# Altium footprint library PCB_IntegratedCircuit.PcbLib: 82 footprints (part 6 of 6)
Each footprint in its own frame and in the unit in brackets; x right, y up, seen from the top. Pads: shape width x height; smd on the part's side, far side on the other; paste and mask are expansions set on the pad; w line width, h text height; cw(c..) or ccw(c..) is an arc to the next point about the centre after c.
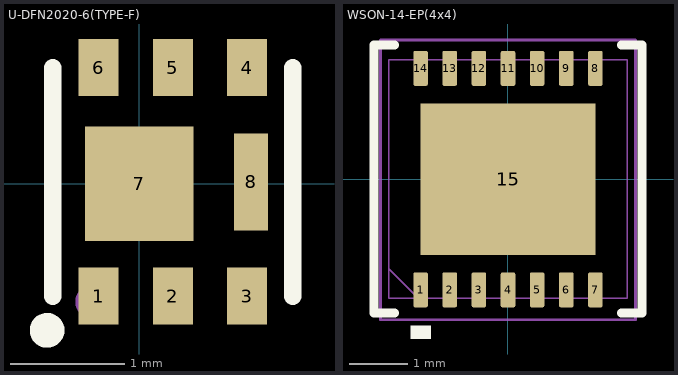
[diagram p5: the footprints below, top view; thin cyan lines are the x and y axes]

## U-DFN2020-6(TYPE-F) [mm]
pads (8):
  rect 0.35x0.5 smd: 1(-0.355,-0.982) 2(0.295,-0.982) 3(0.945,-0.982) 4(0.945,1.018) 5(0.295,1.018) 6(-0.355,1.018)
  rect 0.95x1 smd: 7(0,0)
  rect 0.3x0.85 smd: 8(0.98,0.018)
Top Overlay:
  circle w0.152: c-0.805,-1.282 r0.076
  lines w0.152: -0.755,-0.982 -0.755,1.018 ; 1.345,-0.982 1.345,1.018
Mechanical 6:
  circle w0.152: c-0.405,-1.032 r0.076
3D body "step_temp.STEP": height 0.63, standoff 0, extent -0.7,-1 1.3,1

## WSON-14-EP(4x4) [mm]
pads (15):
  rrect25% 0.25x0.6 smd paste-0.125 mask+0.051: 1(-1.5,-1.9) 2(-1,-1.9) 3(-0.5,-1.9) 4(0,-1.9) 5(0.5,-1.9) 6(1,-1.9) 7(1.5,-1.9) 8(1.5,1.9) 9(1,1.9) 10(0.5,1.9) 11(0,1.9) 12(-0.5,1.9) 13(-1,1.9) 14(-1.5,1.9)
  rect 3x2.6 smd paste-1.3 mask+0.051: 15(0,0)
Top Overlay:
  rectangle: -1.676,-2.743 -1.321,-2.515
  lines w0.152: -1.943,-2.299 -2.299,-2.299 -2.299,2.299 -1.943,2.299 ; 1.943,-2.299 2.299,-2.299 2.299,2.299 1.943,2.299
Top Paste:
  region: 0.1,1.2 0.1,0.1 1.4,0.1 1.4,1.2
  region: -1.4,1.2 -1.4,0.1 -0.1,0.1 -0.1,1.2
  region: 0.1,-0.1 0.1,-1.2 1.4,-1.2 1.4,-0.1
  region: -1.4,-0.1 -1.4,-1.2 -0.1,-1.2 -0.1,-0.1
  region: -1.625,2.403 -1.625,1.803 -1.375,1.803 -1.375,2.403
  region: -1.125,2.403 -1.125,1.803 -0.875,1.803 -0.875,2.403
  region: -0.625,2.403 -0.625,1.803 -0.375,1.803 -0.375,2.403
  region: -0.125,2.403 -0.125,1.803 0.125,1.803 0.125,2.403
  region: 0.375,2.403 0.375,1.803 0.625,1.803 0.625,2.403
  region: 0.875,2.403 0.875,1.803 1.125,1.803 1.125,2.403
  region: 1.375,2.403 1.375,1.803 1.625,1.803 1.625,2.403
  region: 1.375,-1.803 1.375,-2.403 1.625,-2.403 1.625,-1.803
  region: 0.875,-1.803 0.875,-2.403 1.125,-2.403 1.125,-1.803
  region: 0.375,-1.803 0.375,-2.403 0.625,-2.403 0.625,-1.803
  region: -0.125,-1.803 -0.125,-2.403 0.125,-2.403 0.125,-1.803
  region: -0.625,-1.803 -0.625,-2.403 -0.375,-2.403 -0.375,-1.803
  region: -1.125,-1.803 -1.125,-2.403 -0.875,-2.403 -0.875,-1.803
  region: -1.625,-1.803 -1.625,-2.403 -1.375,-2.403 -1.375,-1.803
Mechanical 13:
  lines w0.025: -2.045,-1.537 -1.537,-2.045 ; -2.045,-2.045 2.045,-2.045 2.045,2.045 -2.045,2.045 -2.045,-2.045
B-Component:
  lines w0.051: -2.184,-2.413 -2.184,2.388 2.184,2.388 2.184,-2.413 -2.184,-2.413
3D body "SDA14B.step": height 0.61, standoff 0, extent -2.045,-2.096 2.045,2.096